# Altium footprint library MyComponents_v2.5.PcbLib: 403 footprints (part 22 of 26)
Each footprint in its own frame and in the unit in brackets; x right, y up, seen from the top. Pads: shape width x height; smd on the part's side, far side on the other; paste and mask are expansions set on the pad; w line width, h text height; cw(c..) or ccw(c..) is an arc to the next point about the centre after c.
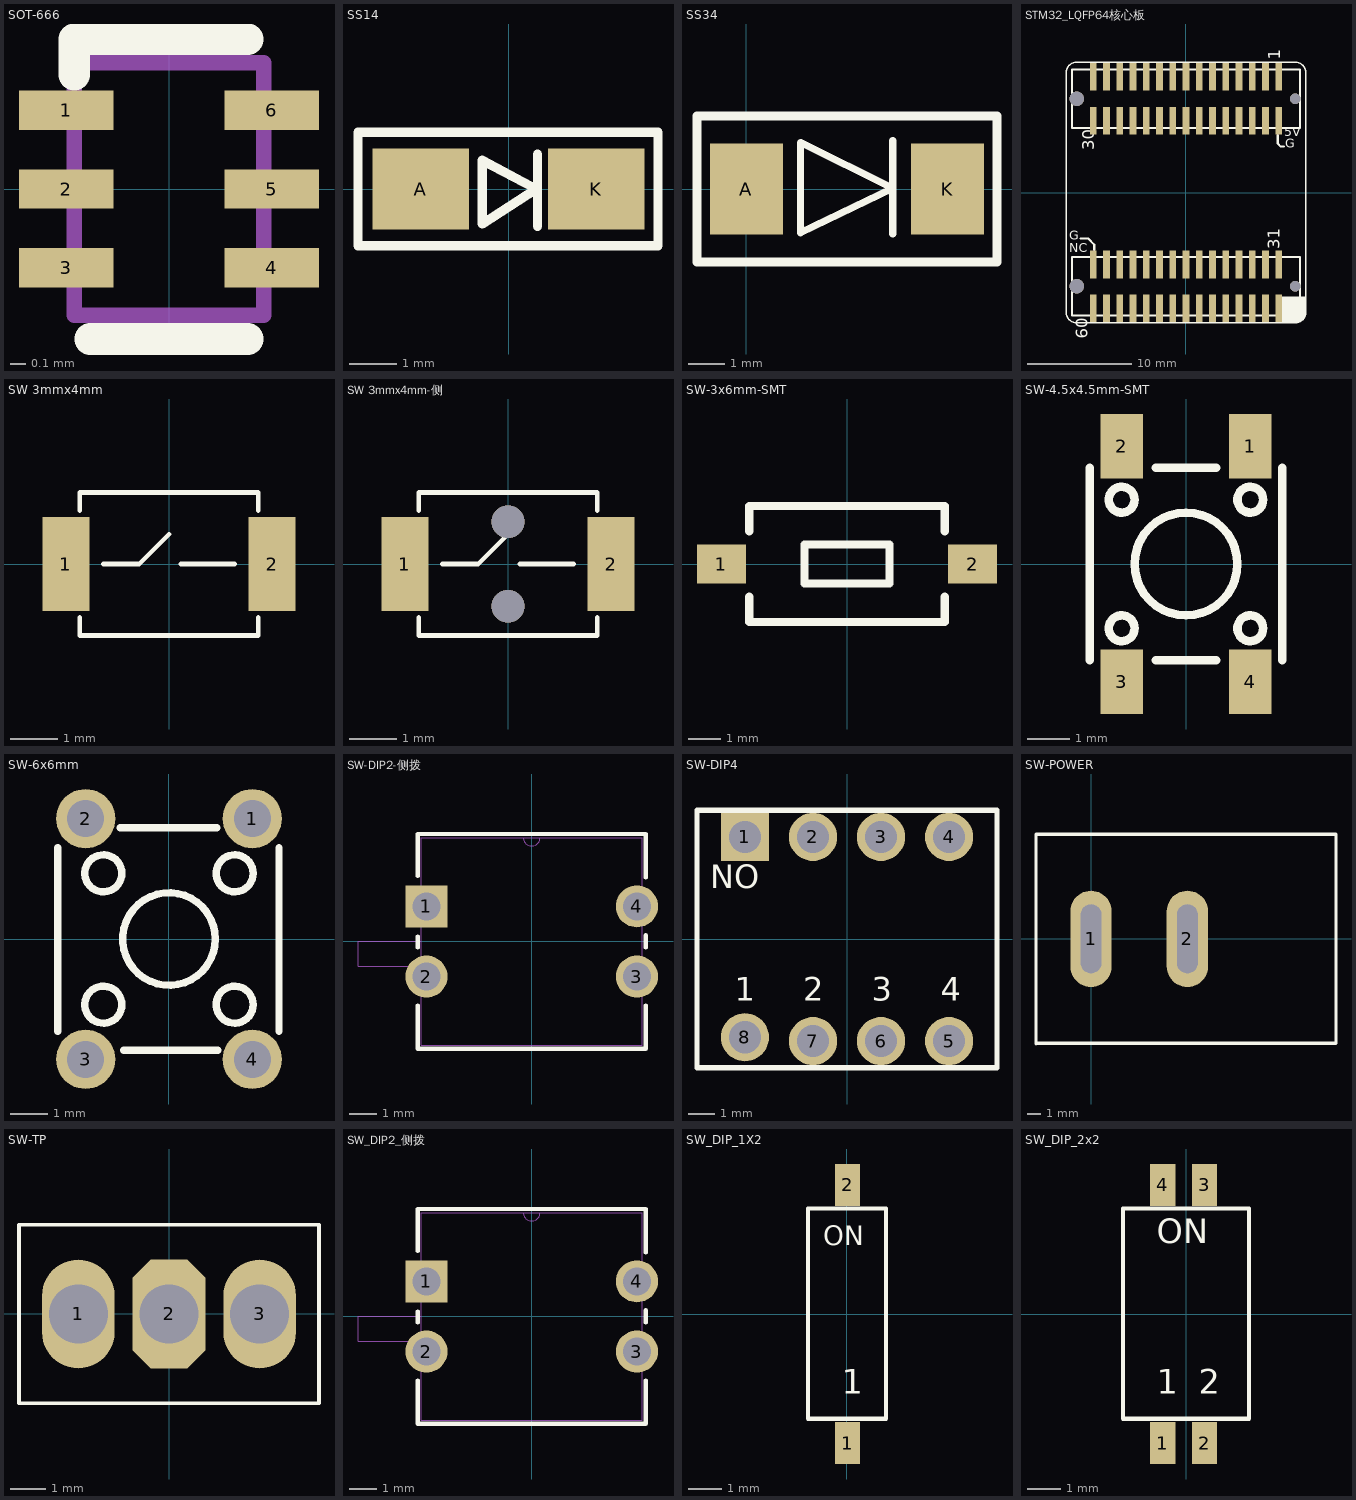
[diagram p21: the footprints below, top view; thin cyan lines are the x and y axes]

## SOT-666 [mm]
pads (6):
  rect 0.6x0.25 smd mask+0.051: 1(-0.65,0.5) 2(-0.65,0) 3(-0.65,-0.5) 4(0.65,-0.5) 5(0.65,0) 6(0.65,0.5)
Top Overlay:
  lines w0.2: -0.5,-0.95 0.5,-0.95 ; 0.5,0.95 -0.6,0.95 -0.6,0.725 ; -0.6,0.725 -0.6,0.725
Mechanical 13:
  lines w0.1: -0.6,-0.8 0.6,-0.8 0.6,0.8 -0.6,0.8 -0.6,-0.8
3D body "SOT666.step": height 0.6, standoff 0, extent -0.8,-0.795 0.8,0.795

## SS14 [mm]
pads (2):
  rect 2.032x1.7 smd: A(-1.85,0) K(1.85,0)
Top Overlay:
  lines w0.199: 0.61,-0.787 0.61,0.737 ; -0.559,-0.737 -0.559,0.61 0.584,0 -0.559,-0.737
  lines w0.2: -3.175,-1.194 -3.175,1.2 3.15,1.2 3.15,-1.2 -3.124,-1.2

## SS34 [mil]
pads (2):
  rect 80x100 smd: A(0,0) K(220,0)
Top Overlay:
  lines w7.85: 160,-49 160,53 ; 59,-48 160,1 59,51 59,-48
  lines w10: -54,-80 -54,80 274,80 274,-80 -54,-80

## STM32_LQFP64核心板 [mm]
pads (60):
  rect 0.65x2.65 smd: 1(8.89,11.1) 2(8.89,6.9) 3(7.62,11.1) 4(7.62,6.9) 5(6.35,11.1) 6(6.35,6.9) 7(5.08,11.1) 8(5.08,6.9) 9(3.81,11.1) 10(3.81,6.9) 11(2.54,11.1) 12(2.54,6.9) 13(1.27,11.1) 14(1.27,6.9) 15(0,11.1) 16(0,6.9) 17(-1.27,11.1) 18(-1.27,6.9) 19(-2.54,11.1) 20(-2.54,6.9) 21(-3.81,11.1) 22(-3.81,6.9) 23(-5.08,11.1) 24(-5.08,6.9) 25(-6.35,11.1) 26(-6.35,6.9) 27(-7.62,11.1) 28(-7.62,6.9) 29(-8.89,11.1) 30(-8.89,6.9) 31(8.89,-6.9) 32(8.89,-11.1) 33(7.62,-6.9) 34(7.62,-11.1) 35(6.35,-6.9) 36(6.35,-11.1) 37(5.08,-6.9) 38(5.08,-11.1) 39(3.81,-6.9) 40(3.81,-11.1) 41(2.54,-6.9) 42(2.54,-11.1) 43(1.27,-6.9) 44(1.27,-11.1) 45(0,-6.9) 46(0,-11.1) 47(-1.27,-6.9) 48(-1.27,-11.1) 49(-2.54,-6.9) 50(-2.54,-11.1) 51(-3.81,-6.9) 52(-3.81,-11.1) 53(-5.08,-6.9) 54(-5.08,-11.1) 55(-6.35,-6.9) 56(-6.35,-11.1) 57(-7.62,-6.9) 58(-7.62,-11.1) 59(-8.89,-6.9) 60(-8.89,-11.1)
via -10.465,-9 diameter 1.4 hole 1.4
via -10.465,9 diameter 1.4 hole 1.4
via 10.465,9 diameter 1 hole 1
via 10.465,-9 diameter 1 hole 1
Top Overlay:
  region: 11.5,-12.5
  region: 9.25,-12.5 9.25,-10 11.5,-10 11.5,-11.75 11.25,-12.25 10.75,-12.5
  lines w0.15: -11.5,-11.5 ccw(c-10.5,-11.5) -10.5,-12.5 10.5,-12.5 ccw(c10.5,-11.5) 11.5,-11.5 11.5,11.5 ccw(c10.5,11.5) 10.5,12.5 -10.5,12.5 ccw(c-10.5,11.5) -11.5,11.5 -11.5,-11.5
  lines w0.2: -10.1,-4.4 -9.4,-4.4 -8.8,-5 -8.8,-5.5 ; 8.8,5.5 8.8,4.7 9.1,4.4 9.4,4.4 ; -10.95,-11.8 10.95,-11.8 10.95,-6.2 -10.95,-6.2 -10.95,-11.8 ; -10.95,6.2 10.95,6.2 10.95,11.8 -10.95,11.8 -10.95,6.2
  text "NC" at -11.2,-6 h1.5
  text "G" at -11.2,-4.8 h1.5
  text "G" at 9.5,4 h1.5
  text "5V" at 9.4,5.1 h1.5
  text "60" at -9.05,-14.05 h2
  text "31" at 9.375,-5.425 h2
  text "30" at -8.4,4.075 h2
  text "1" at 9.4,12.725 h2
3D body: height 7, standoff 0.1, extent -10.95,-11.8 10.95,-6.2
3D body: height 7, standoff 0.1, extent -10.95,6.2 10.95,11.8
3D body "F4核心板": height 10.9, standoff 5.41, extent -11.5,-12.5 11.5,12.5

## SW 3mmx4mm [mm] "小龟按键"
pads (2):
  rect 1x2 smd: 1(-2.2,0) 2(2.2,0)
Top Overlay:
  lines w0.1: -1.905,-1.143 -1.905,-1.524 1.905,-1.524 1.905,-1.143 ; -1.905,1.143 -1.905,1.524 1.905,1.524 1.905,1.143 ; -1.397,0 -0.635,0 0,0.635 ; 0.254,0 1.397,0
3D body "User Library-Switch-CK-KMR2.STEP": height 2.1, standoff 0, extent -2.3,-1.5 2.3,1.5

## SW 3mmx4mm-侧 [mm] "小龟按键3*4 侧按"
pads (2):
  rect 1x2 smd: 1(-2.2,0) 2(2.2,0)
via 0,-0.9 diameter 0.7 hole 0.7
via 0,0.9 diameter 0.7 hole 0.7
Top Overlay:
  lines w0.1: -1.905,-1.143 -1.905,-1.524 1.905,-1.524 1.905,-1.143 ; -1.905,1.143 -1.905,1.524 1.905,1.524 1.905,1.143 ; -1.397,0 -0.635,0 0,0.635 ; 0.254,0 1.397,0
3D body "С?": height 1.51, standoff -0.5, extent -2.4,-2.1 2.4,1.45

## SW-3x6mm-SMT [mm] "两脚贴片轻触开关3x6mm"
pads (2):
  rect 1.5x1.2 smd: 1(-3.85,0) 2(3.85,0)
Top Overlay:
  lines w0.254: -3,-1 -3,-1.778 3,-1.778 3,-1 ; -3,1 -3,1.778 3,1.778 3,1 ; -1.3,-0.6 1.3,-0.6 1.3,0.6 -1.3,0.6 -1.3,-0.6
3D body "TSW SMD-3x6x2.5.STEP": height 2.59, standoff -0.03, extent -4.025,-1.75 3.975,1.75

## SW-4.5x4.5mm-SMT [mm] "四脚贴片轻触开关4.5x4.5mm"
pads (4):
  rect 1x1.5 smd: 1(1.5,2.75) 2(-1.5,2.75) 3(-1.5,-2.75) 4(1.5,-2.75)
Top Overlay:
  circle w0.2: c1.5,1.5 r0.3
  circle w0.2: c-1.5,-1.5 r0.3
  circle w0.2: c1.5,-1.5 r0.3
  circle w0.2: c-1.5,1.5 r0.3
  circle w0.2: c0,0 r1.2
  lines w0.2: -2.25,-2.25 -2.25,2.25 ; -0.7,-2.25 0.7,-2.25 ; -0.7,2.25 0.7,2.25 ; 2.25,-2.25 2.25,2.25

## SW-6x6mm [mm] "四脚按键6x6mm"
pads (4):
  round 1.6 hole 1: 1(2.25,3.25) 2(-2.25,3.25) 3(-2.25,-3.25) 4(2.25,-3.25)
Top Overlay:
  circle w0.2: c-1.773,-1.773 r0.5
  circle w0.2: c1.773,-1.773 r0.5
  circle w0.2: c-1.773,1.773 r0.5
  circle w0.2: c1.773,1.773 r0.5
  circle w0.2: c0,0 r1.25
  lines w0.2: -3,-2.492 -3,2.461 ; -1.318,3 1.287,3 ; -1.222,-3 1.318,-3 ; 2.969,-2.492 2.969,2.461

## SW-DIP2-侧拨 [mil]
pads (4):
  rect 60x60 hole 40 mask+0: 1(-150,50)
  round 60 hole 40 mask+0: 2(-150,-50) 3(150,-50) 4(150,50)
Top Overlay:
  lines w6: -162.5,-91.25 -162.5,-153 162.5,-153 162.5,-91.25 ; -162.5,-8.75 -162.5,6.9 ; -162.5,93.1 -162.5,153 162.5,153 162.5,91.25 ; 162.5,-8.75 162.5,8.75
Mechanical 13:
  lines w0: -12,148 ccw(c0,148) 12,148
  lines w1: -157.5,-35 -247.5,-35 -247.5,0 -157.5,0 ; -170,-70 -157.5,-70 -157.5,-30 -170,-30 -170,-70 ; -170,30 -157.5,30 -157.5,70 -170,70 -170,30 ; -157.5,-148 -157.5,148 157.5,148 157.5,-148 -157.5,-148 ; 157.5,-70 170,-70 170,-30 157.5,-30 157.5,-70 ; 157.5,30 170,30 170,70 157.5,70 157.5,30
  text "*" at -160,25 h50
3D body "拨?": height 236.22, standoff -157.48, extent -255.7,-137.8 173.04,137.8

## SW-DIP4 [mm]
pads (8):
  rect 1.8x1.8 hole 1.2: 1(-3.81,3.81)
  round 1.8 hole 1.2: 2(-1.27,3.81) 3(1.27,3.81) 4(3.81,3.81) 5(3.81,-3.81) 6(1.27,-3.81) 7(-1.27,-3.81) 8(-3.81,-3.67)
Top Overlay:
  lines w0.2: -5.6,-4.8 5.6,-4.8 5.6,4.8 -5.6,4.8 -5.6,-4.8
  text "NO" at -5.1,1.6 h1.5
  text "4" at 3.5,-2.599 h1.5
  text "3" at 0.933,-2.6 h1.5
  text "2" at -1.633,-2.6 h1.5
  text "1" at -4.2,-2.6 h1.5
3D body "SW_DIP4.step": height 6.8, standoff -3.85, extent -5.81,-4.975 5.81,4.925

## SW-POWER [mm]
pads (2):
  oval 3x7 hole 1.5 slot 5 at 90 deg: 1(0,0) 2(7,0)
Top Overlay:
  lines w0.254: -4,-7.62 -4,7.595 17.8,7.595 17.8,-7.595 -4,-7.595

## SW-TP [mil]
pads (3):
  oval 80x120 hole 65: 1(-100,0) 3(100,0)
  oct 80x120 hole 65: 2(0,0)
Top Overlay:
  lines w4: -165.35,-98.43 -165.35,98.42 165.35,98.42 165.35,-98.43 -165.35,-98.43

## SW_DIP2_侧拨 [mil]
pads (4):
  rect 60x60 hole 40 mask+0: 1(-150,50)
  round 60 hole 40 mask+0: 2(-150,-50) 3(150,-50) 4(150,50)
Top Overlay:
  lines w6: -162.5,-91.25 -162.5,-153 162.5,-153 162.5,-91.25 ; -162.5,-8.75 -162.5,6.9 ; -162.5,93.1 -162.5,153 162.5,153 162.5,91.25 ; 162.5,-8.75 162.5,8.75
Mechanical 13:
  lines w0: -12,148 ccw(c0,148) 12,148
  lines w1: -157.5,-35 -247.5,-35 -247.5,0 -157.5,0 ; -170,-70 -157.5,-70 -157.5,-30 -170,-30 -170,-70 ; -170,30 -157.5,30 -157.5,70 -170,70 -170,30 ; -157.5,-148 -157.5,148 157.5,148 157.5,-148 -157.5,-148 ; 157.5,-70 170,-70 170,-30 157.5,-30 157.5,-70 ; 157.5,30 170,30 170,70 157.5,70 157.5,30
  text "*" at -160,25 h50
3D body "拨码开关x2侧?": height 236.22, standoff -157.48, extent -255.7,-137.8 173.04,137.8

## SW_DIP_1X2 [mm]
height 2.2
pads (2):
  rect 0.76x1.27 smd: 1(0.023,-3.912) 2(0.023,3.912)
Top Overlay:
  lines w0.127: -1.177,3.175 -1.177,-3.175 1.18,-3.175 1.18,3.2 -1.177,3.2
  text "1" at -0.161,-2.667 h1.27
  text "ON" at -0.711,1.88 h1
3D body "SW_DIP_1.STEP": height 2.5, standoff 0, extent -1.41,-4.147 1.46,4.144

## SW_DIP_2x2 [mm]
height 2.2
pads (4):
  rect 0.76x1.27 smd: 1(-0.705,-3.912) 2(0.565,-3.912) 3(0.565,3.912) 4(-0.705,3.912)
Top Overlay:
  lines w0.127: -1.905,3.175 -1.905,-3.175 1.865,-3.175 ; -1.905,3.2 1.905,3.2 1.905,-3.175
  text "1" at -0.889,-2.667 h1.27
  text "2" at 0.381,-2.667 h1.27
  text "ON" at -0.889,1.905 h1.27
3D body "SW_DIP2.STEP": height 2.4, standoff 0, extent -2.083,-4.064 2.057,4.226